# Altium footprint library 9-Pcblib_Con.PcbLib: 266 footprints (part 16 of 17)
Each footprint in its own frame and in the unit in brackets; x right, y up, seen from the top. Pads: shape width x height; smd on the part's side, far side on the other; paste and mask are expansions set on the pad; w line width, h text height; cw(c..) or ccw(c..) is an arc to the next point about the centre after c.
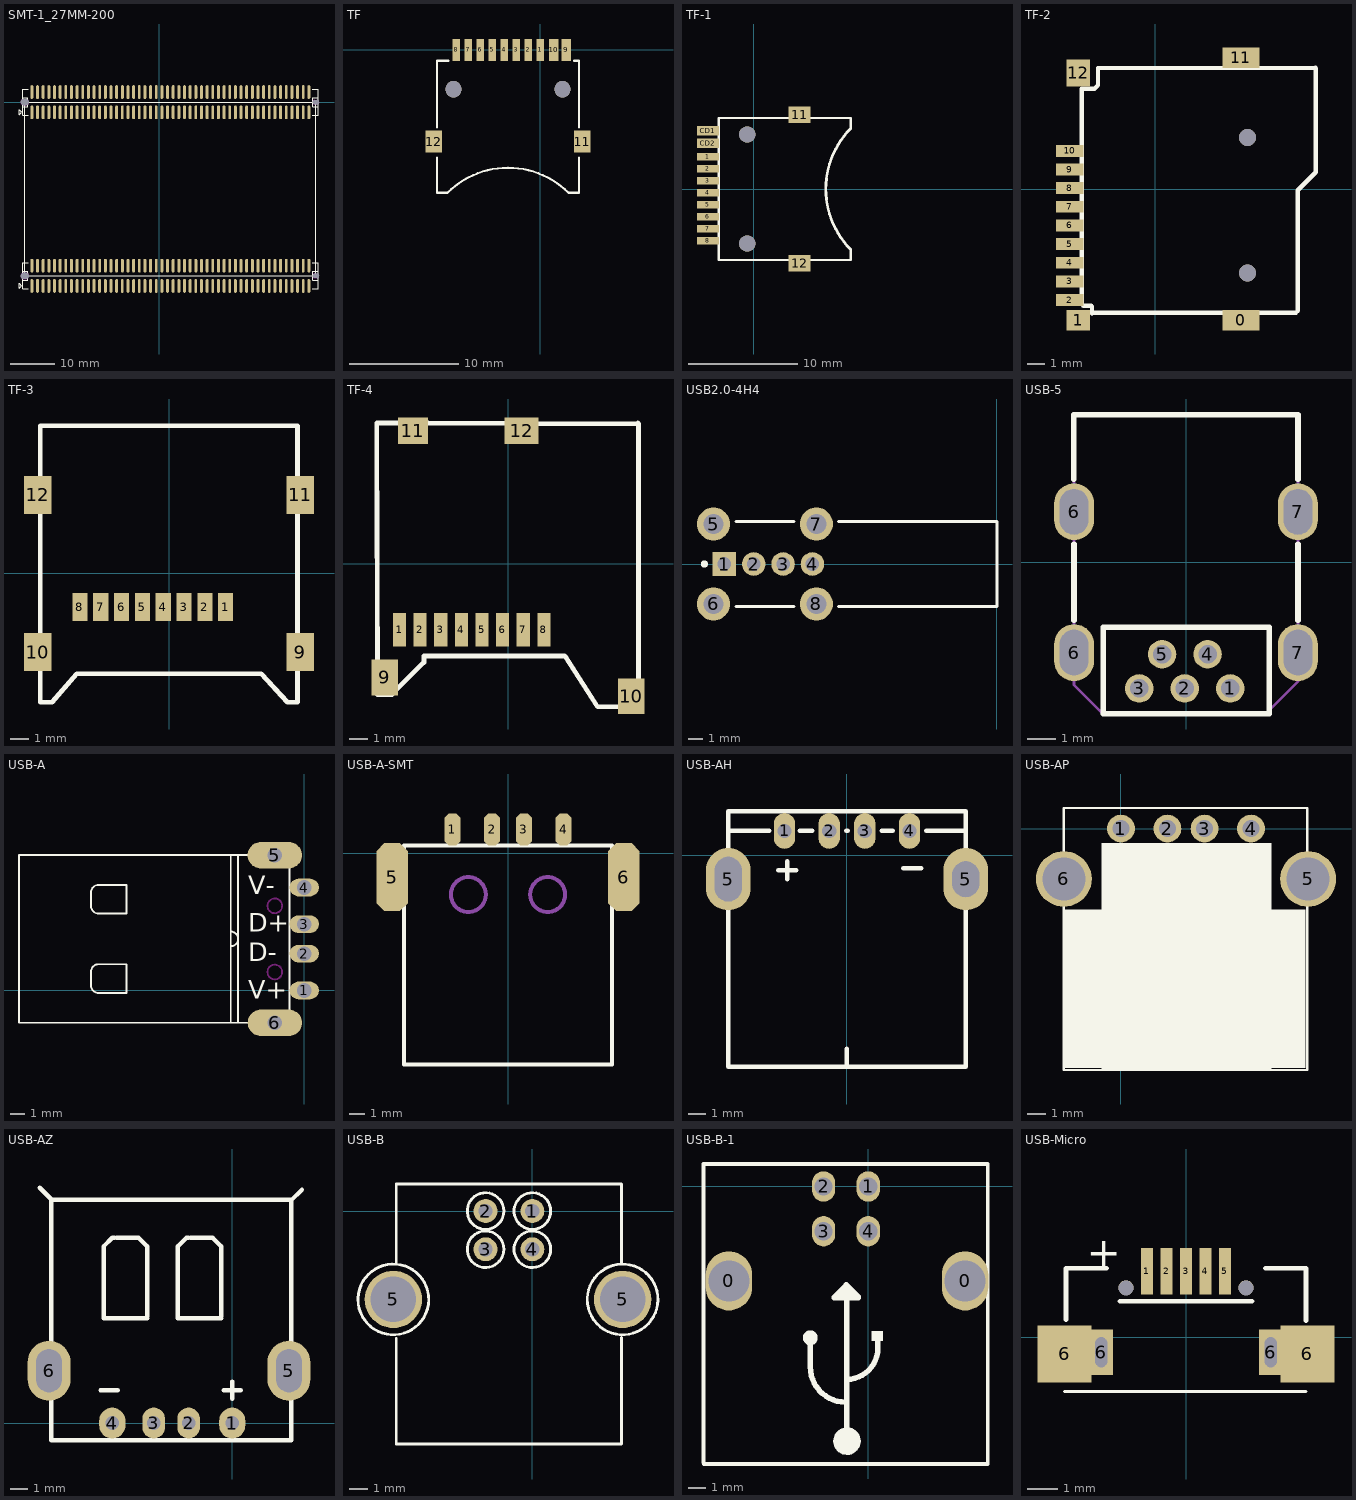
[diagram p15: the footprints below, top view; thin cyan lines are the x and y axes]

## SMT-1_27MM-200 [mm]
pads (204):
  round 0 hole 1.3 slot 1.8 at 0 deg unplated: 0(-30.147,-39.025) 0(-30.147,-0.025)
  round 0 hole 0.9 slot 1.4 at 0 deg unplated: 0(35.233,-39.025) 0(35.233,-0.025)
  oval 0.65x3.1 smd: 1(-28.575,-41.3) 2(-28.572,-36.75) 3(-27.305,-41.3) 4(-27.302,-36.75) 5(-26.035,-41.3) 6(-26.032,-36.75) 7(-24.765,-41.3) 8(-24.762,-36.75) 9(-23.495,-41.3) 10(-23.492,-36.75) 11(-22.225,-41.3) 12(-22.222,-36.75) 13(-20.955,-41.3) 14(-20.952,-36.75) 15(-19.685,-41.3) 16(-19.682,-36.75) 17(-18.415,-41.3) 18(-18.412,-36.75) 19(-17.145,-41.3) 20(-17.142,-36.75) 21(-15.875,-41.3) 22(-15.872,-36.75) 23(-14.605,-41.3) 24(-14.602,-36.75) 25(-13.335,-41.3) 26(-13.332,-36.75) 27(-12.065,-41.3) 28(-12.062,-36.75) 29(-10.795,-41.3) 30(-10.792,-36.75) 31(-9.525,-41.3) 32(-9.522,-36.75) 33(-8.255,-41.3) 34(-8.252,-36.75) 35(-6.985,-41.3) 36(-6.982,-36.75) 37(-5.715,-41.3) 38(-5.712,-36.75) 39(-4.445,-41.3) 40(-4.442,-36.75) 41(-3.175,-41.3) 42(-3.172,-36.75) 43(-1.905,-41.3) 44(-1.902,-36.75) 45(-0.635,-41.3) 46(-0.632,-36.75) 47(0.635,-41.3) 48(0.638,-36.75) 49(1.905,-41.3) 50(1.908,-36.75) 51(3.175,-41.3) 52(3.178,-36.75) 53(4.445,-41.3) 54(4.448,-36.75) 55(5.715,-41.3) 56(5.718,-36.75) 57(6.985,-41.3) 58(6.988,-36.75) 59(8.255,-41.3) 60(8.258,-36.75) 61(9.525,-41.3) 62(9.528,-36.75) 63(10.795,-41.3) 64(10.798,-36.75) 65(12.065,-41.3) 66(12.068,-36.75) 67(13.335,-41.3) 68(13.338,-36.75) 69(14.605,-41.3) 70(14.608,-36.75) 71(15.875,-41.3) 72(15.878,-36.75) 73(17.145,-41.3) 74(17.148,-36.75) 75(18.415,-41.3) 76(18.418,-36.75) 77(19.685,-41.3) 78(19.688,-36.75) 79(20.955,-41.3) 80(20.958,-36.75) 81(22.225,-41.3) 82(22.228,-36.75) 83(23.495,-41.3) 84(23.498,-36.75) 85(24.765,-41.3) 86(24.768,-36.75) 87(26.035,-41.3) 88(26.038,-36.75) 89(27.305,-41.3) 90(27.308,-36.75) 91(28.575,-41.3) 92(28.578,-36.75) 93(29.845,-41.3) 94(29.848,-36.75) 95(31.115,-41.3) 96(31.118,-36.75) 97(32.385,-41.3) 98(32.388,-36.75) 99(33.655,-41.3) 100(33.658,-36.75) 101(-28.575,-2.3) 102(-28.572,2.25) 103(-27.305,-2.3) 104(-27.302,2.25) 105(-26.035,-2.3) 106(-26.032,2.25) 107(-24.765,-2.3) 108(-24.762,2.25) 109(-23.495,-2.3) 110(-23.492,2.25) 111(-22.225,-2.3) 112(-22.222,2.25) 113(-20.955,-2.3) 114(-20.952,2.25) 115(-19.685,-2.3) 116(-19.682,2.25) 117(-18.415,-2.3) 118(-18.412,2.25) 119(-17.145,-2.3) 120(-17.142,2.25) 121(-15.875,-2.3) 122(-15.872,2.25) 123(-14.605,-2.3) 124(-14.602,2.25) 125(-13.335,-2.3) 126(-13.332,2.25) 127(-12.065,-2.3) 128(-12.062,2.25) 129(-10.795,-2.3) 130(-10.792,2.25) 131(-9.525,-2.3) 132(-9.522,2.25) 133(-8.255,-2.3) 134(-8.252,2.25) 135(-6.985,-2.3) 136(-6.982,2.25) 137(-5.715,-2.3) 138(-5.712,2.25) 139(-4.445,-2.3) 140(-4.442,2.25) 141(-3.175,-2.3) 142(-3.172,2.25) 143(-1.905,-2.3) 144(-1.902,2.25) 145(-0.635,-2.3) 146(-0.632,2.25) 147(0.635,-2.3) 148(0.638,2.25) 149(1.905,-2.3) 150(1.908,2.25) 151(3.175,-2.3) 152(3.178,2.25) 153(4.445,-2.3) 154(4.448,2.25) 155(5.715,-2.3) 156(5.718,2.25) 157(6.985,-2.3) 158(6.988,2.25) 159(8.255,-2.3) 160(8.258,2.25) 161(9.525,-2.3) 162(9.528,2.25) 163(10.795,-2.3) 164(10.798,2.25) 165(12.065,-2.3) 166(12.068,2.25) 167(13.335,-2.3) 168(13.338,2.25) 169(14.605,-2.3) 170(14.608,2.25) 171(15.875,-2.3) 172(15.878,2.25) 173(17.145,-2.3) 174(17.148,2.25) 175(18.415,-2.3) 176(18.418,2.25) 177(19.685,-2.3) 178(19.688,2.25) 179(20.955,-2.3) 180(20.958,2.25) 181(22.225,-2.3) 182(22.228,2.25) 183(23.495,-2.3) 184(23.498,2.25) 185(24.765,-2.3) 186(24.768,2.25) 187(26.035,-2.3) 188(26.038,2.25) 189(27.305,-2.3) 190(27.308,2.25) 191(28.575,-2.3) 192(28.578,2.25) 193(29.845,-2.3) 194(29.848,2.25) 195(31.115,-2.3) 196(31.118,2.25) 197(32.385,-2.3) 198(32.388,2.25) 199(33.655,-2.3) 200(33.658,2.25)
Top Overlay:
  lines w0.2: -30.667,-40.025 -29.457,-40.025 -29.457,-38.025 -30.667,-38.025 ; -30.667,-1.025 -29.457,-1.025 -29.457,0.975 -30.667,0.975 ; -30.147,-0.025 35.233,-0.025 35.233,-39 -30.147,-39 -30.147,0 ; -29.35,-41.925 -30.667,-41.925 -30.667,-36.125 -29.35,-36.125 ; -29.35,-2.925 -30.667,-2.925 -30.667,2.875 -29.35,2.875 ; 34.437,-41.925 35.753,-41.925 35.753,-36.125 34.437,-36.125 ; 34.437,-2.925 35.753,-2.925 35.753,2.875 34.437,2.875 ; 35.753,-40.025 34.543,-40.025 34.543,-38.025 35.753,-38.025 ; 35.753,-1.025 34.543,-1.025 34.543,0.975 35.753,0.975 ; -31.461,-41.854 -30.95,-41.342 -30.95,-41.225 -31.461,-40.714 -31.461,-41.854 ; -31.461,-2.854 -31.461,-1.714 -30.95,-2.225 -30.95,-2.342 -31.461,-2.854
Keep-Out Layer:
  lines w0: -30.397,-39.675 cw(c-30.397,-39.025) -30.397,-38.375 -29.897,-38.375 cw(c-29.897,-39.025) -29.897,-39.675 -30.397,-39.675 ; -30.397,-0.675 cw(c-30.397,-0.025) -30.397,0.625 -29.897,0.625 cw(c-29.897,-0.025) -29.897,-0.675 -30.397,-0.675 ; 34.983,-39.475 cw(c34.983,-39.025) 34.983,-38.575 35.483,-38.575 cw(c35.483,-39.025) 35.483,-39.475 34.983,-39.475 ; 34.983,-0.475 cw(c34.983,-0.025) 34.983,0.425 35.483,0.425 cw(c35.483,-0.025) 35.483,-0.475 34.983,-0.475

## TF [mm]
pads (12):
  rect 0.7x2 smd: 1(0,0) 2(-1.1,0) 3(-2.2,0) 4(-3.3,0) 5(-4.4,0) 6(-5.5,0) 7(-6.6,0) 8(-7.7,0)
  rect 0.85x2 smd: 9(2.4,0) 10(1.25,0)
  rect 1.5x2 smd: 11(3.87,-8.4) 12(-9.77,-8.4)
via 2.05,-3.6 diameter 1.5 hole 1.5
via -7.95,-3.6 diameter 1.5 hole 1.5
Top Overlay:
  lines w0.2: -9.465,-9.872 -9.465,-13.1 -8.5,-13.1 cw(c-2.95,-18.65) 2.6,-13.1 3.565,-13.1 3.565,-9.872 ; -9.465,-7.103 -9.465,-1 -8.417,-1 ; 3.108,-1 3.565,-1 3.565,-7.103

## TF-1 [mm]
pads (14):
  rect 2x0.7 smd: 1(-4.2,2.95) 2(-4.2,1.85) 3(-4.2,0.75) 4(-4.2,-0.35) 5(-4.2,-1.45) 6(-4.2,-2.55) 7(-4.2,-3.65) 8(-4.2,-4.75)
  rect 2x1.5 smd: 11(4.2,6.82) 12(4.2,-6.82)
  rect 2x0.85 smd: CD1(-4.2,5.35) CD2(-4.2,4.2)
  round 1.5 hole 1.5 unplated: ""(-0.6,-5)
  round 1.5 hole 1.5: ""(-0.6,5)
Top Overlay:
  lines w0.2: 8.9,-5.55 8.9,-6.515 -3.2,-6.515 -3.2,6.515 8.9,6.515 8.9,5.55
  lines w0.254: 8.9,-5.55 cw(c14.45,0) 8.9,5.55

## TF-2 [mm]
pads (13):
  rect 2.2x1.2 smd: 0(5.05,-7.75) 11(5.05,7.75)
  rect 1.4x1.2 smd: 1(-4.55,-7.75)
  rect 1.6x0.7 smd: 2(-5.05,-6.55) 3(-5.05,-5.45) 4(-5.05,-4.35) 5(-5.05,-3.25) 6(-5.05,-2.15) 7(-5.05,-1.05) 8(-5.05,0.05) 9(-5.05,1.15) 10(-5.05,2.25)
  rect 1.4x1.6 smd: 12(-4.55,6.85)
via 5.45,3.05 diameter 1 hole 1
via 5.45,-4.95 diameter 1 hole 1
Top Layer:
  lines w0.254: -3.738,-7.344 -3.688,-7.293
Top Overlay:
  lines w0.254: -3.738,-7.344 -3.738,-6.937 -3.789,-6.886 -4.246,-6.886 -4.348,-6.785 -4.348,5.915 -3.586,5.915 -3.383,6.118 -3.383,7.134 9.45,7.15 ; -3.688,-7.293 8.301,-7.293 8.403,-7.191 8.403,-0.079 9.47,0.988 9.47,7.13

## TF-3 [mm]
pads (12):
  rect 0.8x1.5 smd: 1(2.993,-1.772) 2(1.893,-1.772) 3(0.793,-1.772) 4(-0.307,-1.772) 5(-1.407,-1.772) 6(-2.507,-1.772) 7(-3.607,-1.772) 8(-4.707,-1.772)
  rect 1.45x2 smd: 9(6.925,-4.15) 10(-6.925,-4.15) 11(6.925,4.15) 12(-6.925,4.15)
Top Overlay:
  lines w0.254: -6.805,-6.8 -6.805,7.8 6.795,7.8 6.795,-6.8 6.264,-6.8 4.865,-5.3 -4.875,-5.3 -6.182,-6.8 -6.805,-6.8

## TF-4 [mm]
pads (12):
  rect 0.7x1.8 smd: 1(-5.785,-3.525) 2(-4.685,-3.525) 3(-3.585,-3.525) 4(-2.485,-3.525) 5(-1.385,-3.525) 6(-0.285,-3.525) 7(0.815,-3.525) 8(1.915,-3.525)
  rect 1.4x1.9 smd: 9(-6.575,-6.075) 10(6.575,-7.075)
  rect 1.6x1.4 smd: 11(-5.075,7.075)
  rect 1.8x1.4 smd: 12(0.725,7.075)
Top Overlay:
  lines w0.254: -4.261,7.499 -7.004,7.499 ; 6.864,7.448 -7.004,7.499 ; 6.915,7.499 6.966,7.448 6.966,-7.64 ; 7.017,-7.589 6.966,-7.64 ; -7.004,7.499 -6.953,-6.979 -6.191,-6.979 -4.485,-5.273 -4.485,-4.925 2.935,-4.925 3.032,-4.925 4.781,-7.64 6.966,-7.64

## USB2.0-4H4 [mm]
pads (8):
  rect 1.6x1.6 hole 0.92: 1(-18.56,0)
  round 1.6 hole 0.92: 2(-16.56,0) 3(-14.56,0) 4(-12.56,0)
  round 2.25 hole 1.35: 5(-19.29,2.72) 6(-19.29,-2.72) 7(-12.29,2.72) 8(-12.29,-2.72)
Top Overlay:
  circle w0.25: c-19.91,0 r0.125
  lines w0.2: -17.773,-2.88 -13.807,-2.88 ; -17.773,2.88 -13.807,2.88 ; -10.773,-2.88 0,-2.88 0,2.88 -10.773,2.88
3D body: height 2.99, standoff -15.15, extent -19.912,-3.683 -0.662,3.567

## USB-5 [mm]
pads (9):
  round 1 hole 0.65: 1(1.558,-4.435) 2(-0.042,-4.435) 3(-1.642,-4.435) 4(0.758,-3.235) 5(-0.842,-3.235)
  oval 1.4x2 hole 1 slot 1.6 at 90 deg: 6(-3.937,-3.175) 6(-3.937,1.778) 7(3.937,-3.175) 7(3.937,1.778)
Top Overlay:
  lines w0.2: -3.942,2.921 -3.942,5.192 3.937,5.192 3.937,2.921 ; -3.937,-2.032 -3.937,0.635 ; 3.937,-2.032 3.937,0.635 ; -2.912,-5.324 2.93,-5.324 2.93,-2.286 -2.912,-2.286 -2.912,-3.292 -2.912,-5.324
Mechanical 13:
  lines w0.1: -3.937,-4.318 -2.921,-5.334 2.794,-5.334 3.937,-4.191 3.937,5.217 -3.937,5.217 -3.937,-4.318
3D body: height 4.45, standoff -1.3, extent -3.875,-4.674 3.825,4.326

## USB-A [mm]
pads (6):
  oval 2x1.2 hole 1: 1(0,0) 2(0.003,2.503) 3(0.003,4.506) 4(0.006,7)
  oval 3.7x1.8 hole 1: 5(-1.997,9.197) 6(-1.994,-2.198)
Top Overlay:
  lines w0.127: -4.998,-2.195 -4.998,9.205 ; -4.998,3.005 ccw(c-4.998,3.505) -4.998,4.005 ; -4.498,-2.195 -4.498,9.205 ; -3.398,-2.195 -19.398,-2.195 -19.398,9.205 -3.398,9.205 ; -0.998,-1.705 -0.998,8.715 ; -14.498,0.33 ccw(c-13.998,0.33) -13.998,-0.17 -12.098,-0.17 -12.098,1.78 -13.998,1.78 ccw(c-13.998,1.28) -14.498,1.28 -14.498,0.33 ; -14.498,5.73 ccw(c-13.998,5.73) -13.998,5.23 -12.098,5.23 -12.098,7.18 -13.998,7.18 ccw(c-13.998,6.68) -14.498,6.68 -14.498,5.73
  text "D-" at -3.789,1.976 h1.27
  text "V-" at -3.789,6.548 h1.27
  text "V+" at -3.789,-0.564 h1.27
  text "D+" at -3.789,4.008 h1.27
Keep-Out Layer:
  circle w0.127: c-1.998,1.255 r0.5
  circle w0.127: c-1.998,5.755 r0.5
  lines w0.127: -2.898,-2.695 cw(c-2.898,-2.195) -2.898,-1.695 -1.098,-1.695 cw(c-1.098,-2.195) -1.098,-2.695 -2.898,-2.695 ; -2.898,8.705 cw(c-2.898,9.205) -2.898,9.705 -1.098,9.705 cw(c-1.098,9.205) -1.098,8.705 -2.898,8.705

## USB-A-SMT [mm]
pads (6):
  oct 1x2 smd: 1(-3.5,1.5) 2(-1,1.5) 3(1,1.5) 4(3.5,1.5)
  oct 2x4.3 smd: 5(-7.3,-1.5) 6(7.3,-1.5)
Top Overlay:
  lines w0.254: -6.55,-13.3 6.55,-13.3 6.55,0.5 -6.55,0.5 -6.55,-13.3
Mechanical 1:
  circle w0.254: c2.5,-2.6 r1.1
  circle w0.254: c-2.5,-2.6 r1.1
3D body: height 6.35, standoff -1.53, extent -7.289,-13.267 7.311,1.863

## USB-AH [mm]
pads (6):
  oval 1.2x2 hole 0.8: 1(-3.5,1.35) 2(-1,1.35) 3(1,1.35) 4(3.5,1.35)
  oval 2.5x3.5 hole 1.5 slot 2.5 at 90 deg: 5(-6.65,-1.35)
  oval 2.5x3.5 hole 1.5 slot 2 at 90 deg: 5(6.65,-1.35)
Top Overlay:
  lines w0.254: -6.65,1.35 -4.35,1.35 ; -3.85,-0.85 -2.85,-0.85 ; -3.35,-1.35 -3.35,-0.35 ; -2.65,1.35 -1.95,1.35 ; -0.05,1.35 0.05,1.35 ; -0.01,-11.85 -0.01,-10.85 ; 1.95,1.35 2.55,1.35 ; 3.15,-0.75 4.15,-0.75 ; 4.45,1.35 6.65,1.35 ; -6.65,-11.85 6.65,-11.85 6.65,2.45 -6.65,2.45 -6.65,-11.85
3D body: height 7.55, standoff -3.3, extent -7.905,-11.71 7.895,2.45

## USB-AP [mm]
pads (6):
  round 1.5 hole 0.92: 1(0,0) 2(2.5,0) 3(4.5,0) 4(7,0)
  round 3 hole 2.3: 5(10.07,-2.71) 6(-3.07,-2.71)
Top Overlay:
  rectangle: -1.044,-12.93 8.1,-0.788
  rectangle: -3.025,-12.879 9.929,-4.344
  lines w0.127: -3.07,-12.99 10.03,-12.99 10.03,1.11 -3.07,1.11 -3.07,-2.71 -3.07,-12.99

## USB-AZ [mm]
height 0.127
pads (6):
  oval 1.524x1.8 hole 0.8: 1(0,0) 4(-6.985,0)
  oval 1.324x1.8 hole 0.8: 2(-2.54,0) 3(-4.572,0)
  oval 2.5x3.5 hole 1.5 slot 2.5 at 90 deg: 5(3.302,3.048) 6(-10.668,3.048)
Top Overlay:
  lines w0.254: -11.214,13.703 -10.516,13.005 ; -7.67,1.917 -6.67,1.917 ; -6.858,10.795 -6.985,10.795 -7.493,10.287 -7.493,6.096 -4.953,6.096 ; -6.731,10.795 -5.461,10.795 -4.953,10.287 -4.953,6.223 ; -2.54,10.795 -2.667,10.795 -3.175,10.287 -3.175,6.096 -0.635,6.096 ; -2.413,10.795 -1.143,10.795 -0.635,10.287 -0.635,6.223 ; -0.497,1.919 0.503,1.919 ; 0.003,1.419 0.003,2.419 ; 3.429,12.954 4.064,13.589 ; -10.541,-1 3.429,-1 3.429,13 -10.541,13 -10.541,-1
3D body: height 7.55, standoff -3.3, extent -11.405,-1.009 4.395,13.151

## USB-B [mil]
height 43.31
pads (6):
  round 50 hole 30: 1(0,0) 2(-98,0) 3(-98,-80) 4(0,-80)
  round 120 hole 95: 5(-291,-185) 5(189,-185)
Top Overlay:
  circle w6: c0,-80 r38.3
  circle w6: c0,0 r38.3
  circle w6: c-98,-80 r38.3
  circle w6: c-98,0 r38.3
  lines w6: -365.04,-185 ccw(c-291,-185) -365,-182.5 ; -285,-266.5 -285,-488 187,-488 187,-264.5 ; -285,-108.5 -285,57 187,57 187,-110.5 ; 114.96,-185 ccw(c189,-185) 115,-182.5
3D body: height 123.15, standoff -436.69, extent -343.52,-603.86 241.48,37.87

## USB-B-1 [mm]
pads (6):
  oval 2.6x3.3 hole 2.3: 0(-7.789,-5.281) 0(5.411,-5.281)
  oval 1.3x1.7 hole 1.016: 1(0,0) 2(-2.5,0) 3(-2.5,-2.5) 4(0,-2.5)
Top Overlay:
  rectangle: 0.186,-8.631 0.836,-8.081
  rectangle: -3.339,-8.531 -3.139,-8.331
  rectangle: -1.514,-14.706 -0.814,-13.756
  lines w0.203: -9.206,-15.432 -9.206,1.256 6.669,1.256 6.669,-15.508 ; -9.189,0.169 -9.189,-15.506 6.686,-15.506 6.686,0.169 ; -9.114,1.236 6.686,1.236
  lines w0.305: -3.239,-8.581 -3.239,-10.081 ccw(c-1.264,-10.081) -1.264,-12.056 ; -3.025,-8.605 cw(c-3.239,-8.456) -2.989,-8.532 ; -1.914,-6.206 -0.564,-6.206 -0.814,-5.956 -1.639,-5.956 ; -1.889,-6.181 -1.214,-5.506 -1.214,-13.981 ; -1.614,-13.906 ccw(c-1.214,-14.156) -1.564,-13.84 ; -1.516,-13.707 ccw(c-1.189,-14.231) -1.469,-13.681 ; -1.239,-5.756 -1.239,-5.481 -0.564,-6.156 ; -1.214,-10.781 ccw(c-1.214,-9.031) 0.536,-9.031 0.536,-8.681 ; -1.09,-13.979 ccw(c-1.264,-14.106) -1.05,-14.079

## USB-Micro [mm]
pads (11):
  rect 0.4x1.55 smd: 1(-1.3,2.2) 2(-0.65,2.2) 3(0,2.2) 4(0.65,2.2) 5(1.3,2.2)
  rect 1.8x1.9 smd: 6(-4.05,-0.55) 6(4.05,-0.55)
  rect 0.8x1.5 hole 0.4 slot 1 at 90 deg: 6(-2.825,-0.5) 6(2.825,-0.5)
  round 0.5 hole 0.5 unplated: ""(-2,1.65) ""(2,1.65)
Top Overlay:
  lines w0.1: -4.05,-1.8 4,-1.8
  lines w0.152: -4,0.584 -4,2.3 -2.65,2.3 ; -2.2,1.2 2.2,1.2 ; 2.65,2.3 4,2.3 4,0.55
  text "+" at -3.3,2.35 h1
Keep-Out Layer:
  lines w0.127: -3.054,-1.043 -3.054,0.075 -2.596,0.075 -2.596,-1.043 -3.054,-1.043 ; 2.596,-1.043 2.596,0.075 3.054,0.075 3.054,-1.043 2.596,-1.043
Mechanical 1:
  lines w0.127: -3.054,-1.043 -2.596,-1.043 -2.596,0.075 -3.054,0.075 -3.054,-1.043 ; 2.596,-1.043 3.054,-1.043 3.054,0.075 2.596,0.075 2.596,-1.043